# Altium footprint library Package_SO.PcbLib: 333 footprints (part 17 of 21)
Each footprint in its own frame and in the unit in brackets; x right, y up, seen from the top. Pads: shape width x height; smd on the part's side, far side on the other; paste and mask are expansions set on the pad; w line width, h text height; cw(c..) or ccw(c..) is an arc to the next point about the centre after c.
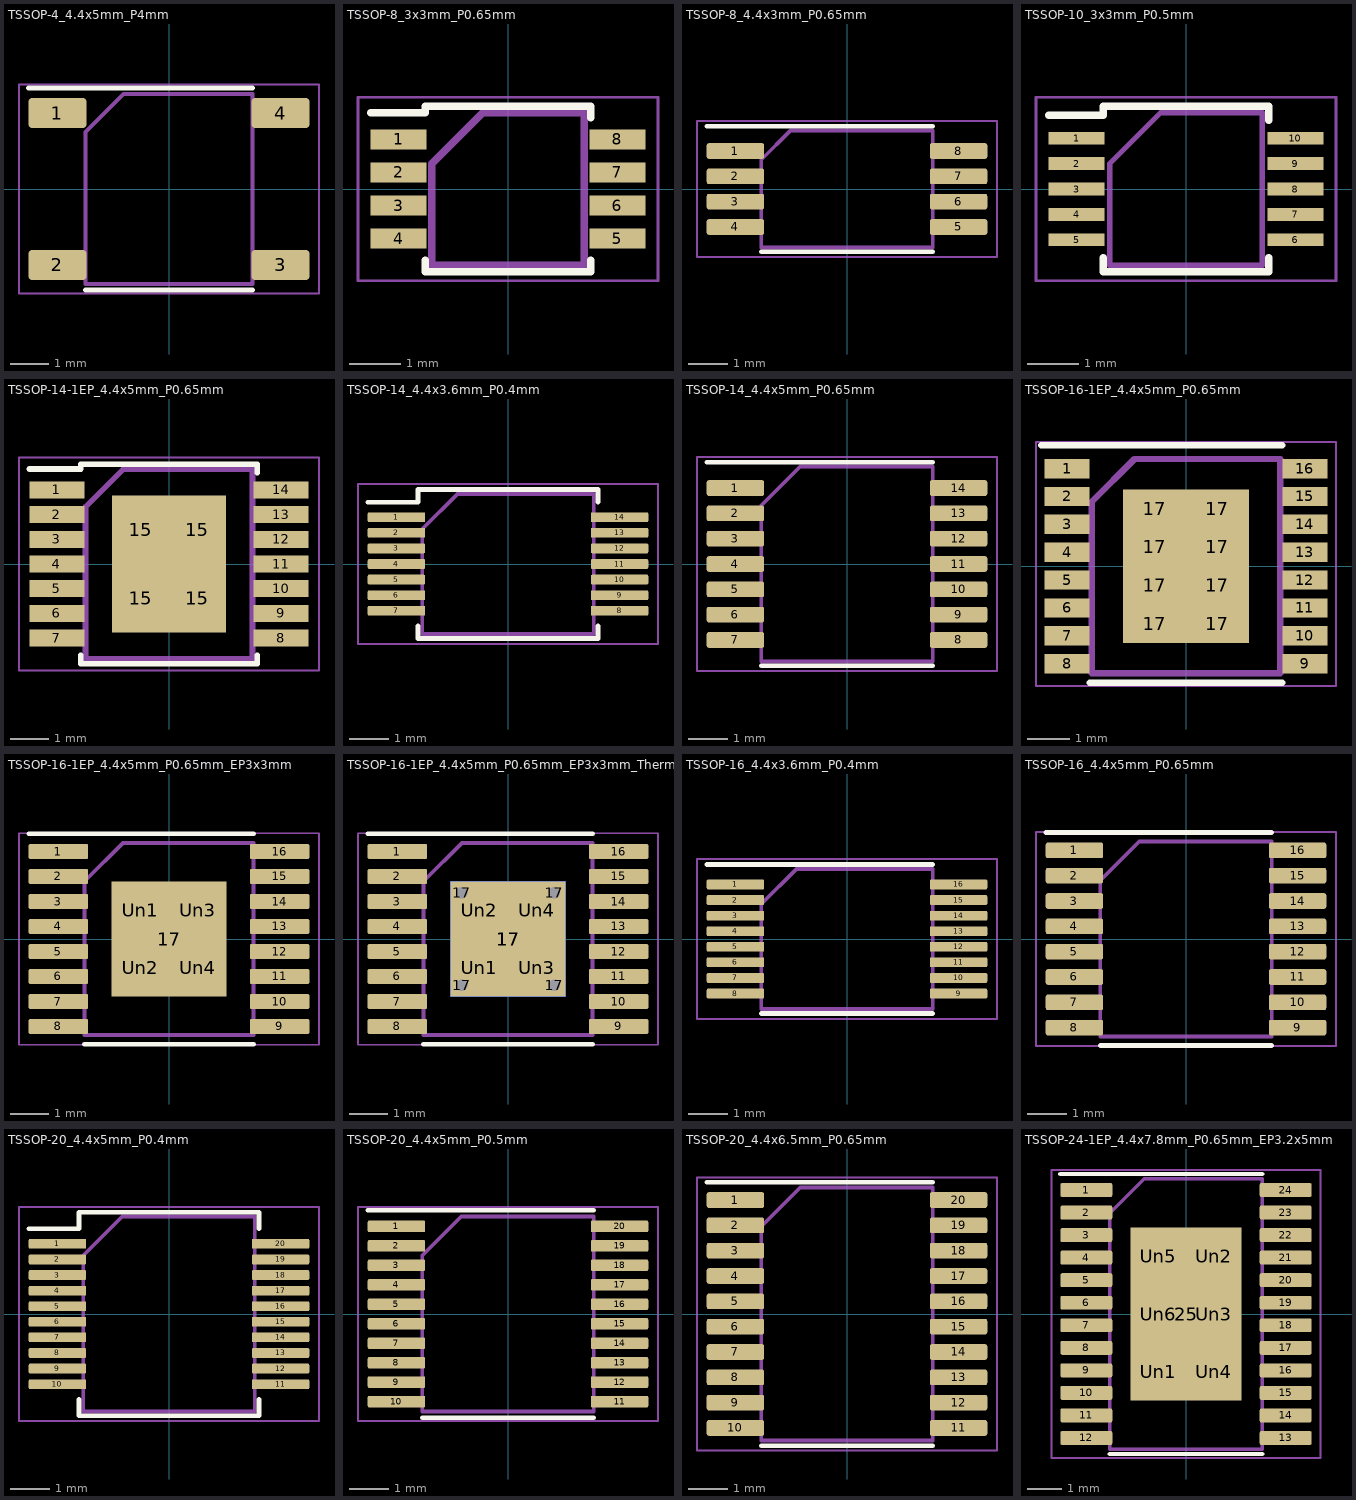
[diagram p16: the footprints below, top view; thin cyan lines are the x and y axes]

## TSSOP-4_4.4x5mm_P4mm [mm]
pads (4):
  rrect25% 1.525x0.8 smd: 1(-2.937,2) 2(-2.937,-2) 3(2.937,-2) 4(2.937,2)
F.SilkS:
  lines w0.12: -3.7,2.66 0,2.66 2.2,2.66 ; -2.2,-2.66 0,-2.66 2.2,-2.66
F.CrtYd:
  lines w0.05: -3.95,-2.75 -3.95,2.75 3.95,2.75 3.95,-2.75 -3.95,-2.75
F.Fab:
  lines w0.1: -2.2,-2.5 2.2,-2.5 2.2,2.5 -1.2,2.5 -2.2,1.5 -2.2,-2.5
  text "'.Designator'" at -4.047,-0.84 h1

## TSSOP-8_3x3mm_P0.65mm [mm]
pads (8):
  rect 1.1x0.4 smd: 1(-2.15,0.975) 2(-2.15,0.325) 3(-2.15,-0.325) 4(-2.15,-0.975) 5(2.15,-0.975) 6(2.15,-0.325) 7(2.15,0.325) 8(2.15,0.975)
F.SilkS:
  lines w0.15: -2.7,1.5 -1.625,1.5 -1.625,1.625 1.625,1.625 1.625,1.4 ; -1.625,-1.4 -1.625,-1.625 1.625,-1.625 1.625,-1.4
F.CrtYd:
  lines w0.05: -2.95,-1.8 -2.95,1.8 2.95,1.8 2.95,-1.8 -2.95,-1.8
F.Fab:
  lines w0.15: -1.5,-1.5 1.5,-1.5 1.5,1.5 -0.5,1.5 -1.5,0.5 -1.5,-1.5
  text "'.Designator'" at -2.488,-0.564 h0.6

## TSSOP-8_4.4x3mm_P0.65mm [mm]
pads (8):
  rrect25% 1.475x0.4 smd: 1(-2.863,0.975) 2(-2.863,0.325) 3(-2.863,-0.325) 4(-2.863,-0.975) 5(2.863,-0.975) 6(2.863,-0.325) 7(2.863,0.325) 8(2.863,0.975)
F.SilkS:
  lines w0.12: -3.6,1.61 0,1.61 2.2,1.61 ; -2.2,-1.61 0,-1.61 2.2,-1.61
F.CrtYd:
  lines w0.05: -3.85,-1.75 -3.85,1.75 3.85,1.75 3.85,-1.75 -3.85,-1.75
F.Fab:
  lines w0.1: -2.2,-1.5 -2.2,0.75 -1.45,1.5 2.2,1.5 2.2,-1.5 -2.2,-1.5
  text "'.Designator'" at -4.047,-0.84 h1

## TSSOP-10_3x3mm_P0.5mm [mm]
pads (10):
  rect 1.1x0.25 smd: 1(-2.15,1) 2(-2.15,0.5) 3(-2.15,0) 4(-2.15,-0.5) 5(-2.15,-1) 6(2.15,-1) 7(2.15,-0.5) 8(2.15,0) 9(2.15,0.5) 10(2.15,1)
F.SilkS:
  lines w0.15: -2.7,1.45 -1.625,1.45 -1.625,1.625 1.625,1.625 1.625,1.35 ; -1.625,-1.35 -1.625,-1.625 1.625,-1.625 1.625,-1.35
F.CrtYd:
  lines w0.05: -2.95,-1.8 -2.95,1.8 2.95,1.8 2.95,-1.8 -2.95,-1.8
F.Fab:
  lines w0.1: -1.5,-1.5 -1.5,0.5 -0.5,1.5 1.5,1.5 1.5,-1.5 -1.5,-1.5
  text "'.Designator'" at -2.438,-0.514 h0.6

## TSSOP-14-1EP_4.4x5mm_P0.65mm [mm]
pads (18):
  rect 1.45x0.45 smd: 1(-2.95,1.95) 2(-2.95,1.3) 3(-2.95,0.65) 4(-2.95,0) 5(-2.95,-0.65) 6(-2.95,-1.3) 7(-2.95,-1.95) 8(2.95,-1.95) 9(2.95,-1.3) 10(2.95,-0.65) 11(2.95,0) 12(2.95,0.65) 13(2.95,1.3) 14(2.95,1.95)
  rect 1.5x1.8 smd: 15(-0.75,-0.9) 15(-0.75,0.9) 15(0.75,-0.9) 15(0.75,0.9)
F.SilkS:
  lines w0.15: -3.675,2.5 -2.325,2.5 -2.325,2.625 2.325,2.625 2.325,2.4 ; -2.325,-2.4 -2.325,-2.625 2.325,-2.625 2.325,-2.4
F.CrtYd:
  lines w0.05: -3.95,-2.8 -3.95,2.8 3.95,2.8 3.95,-2.8 -3.95,-2.8
F.Fab:
  lines w0.15: -2.2,-2.5 2.2,-2.5 2.2,2.5 -1.2,2.5 -2.2,1.5 -2.2,-2.5
  text "'.Designator'" at -3.267,-0.702 h0.8

## TSSOP-14_4.4x3.6mm_P0.4mm [mm]
pads (14):
  rrect25% 1.475x0.25 smd: 1(-2.863,1.2) 2(-2.863,0.8) 3(-2.863,0.4) 4(-2.863,0) 5(-2.863,-0.4) 6(-2.863,-0.8) 7(-2.863,-1.2) 8(2.863,-1.2) 9(2.863,-0.8) 10(2.863,-0.4) 11(2.863,0) 12(2.863,0.4) 13(2.863,0.8) 14(2.863,1.2)
F.SilkS:
  lines w0.12: -3.6,1.585 -2.31,1.585 -2.31,1.91 0,1.91 2.31,1.91 2.31,1.585 ; -2.31,-1.585 -2.31,-1.91 0,-1.91 2.31,-1.91 2.31,-1.585
F.CrtYd:
  lines w0.05: -3.85,-2.05 3.85,-2.05 3.85,2.05 -3.85,2.05 -3.85,-2.05
F.Fab:
  lines w0.1: -2.2,-1.8 2.2,-1.8 2.2,1.8 -1.3,1.8 -2.2,0.9 -2.2,-1.8
  text "'.Designator'" at -4.047,-0.84 h1

## TSSOP-14_4.4x5mm_P0.65mm [mm]
pads (14):
  rrect25% 1.475x0.4 smd: 1(-2.863,1.95) 2(-2.863,1.3) 3(-2.863,0.65) 4(-2.863,0) 5(-2.863,-0.65) 6(-2.863,-1.3) 7(-2.863,-1.95) 8(2.863,-1.95) 9(2.863,-1.3) 10(2.863,-0.65) 11(2.863,0) 12(2.863,0.65) 13(2.863,1.3) 14(2.863,1.95)
F.SilkS:
  lines w0.12: -3.6,2.61 0,2.61 2.2,2.61 ; -2.2,-2.61 0,-2.61 2.2,-2.61
F.CrtYd:
  lines w0.05: -3.85,-2.75 -3.85,2.75 3.85,2.75 3.85,-2.75 -3.85,-2.75
F.Fab:
  lines w0.1: -2.2,-2.5 -2.2,1.5 -1.2,2.5 2.2,2.5 2.2,-2.5 -2.2,-2.5
  text "'.Designator'" at -4.047,-0.84 h1

## TSSOP-16-1EP_4.4x5mm_P0.65mm [mm]
pads (24):
  rect 1.05x0.45 smd: 1(-2.775,2.275) 2(-2.775,1.625) 3(-2.775,0.975) 4(-2.775,0.325) 5(-2.775,-0.325) 6(-2.775,-0.975) 7(-2.775,-1.625) 8(-2.775,-2.275) 9(2.775,-2.275) 10(2.775,-1.625) 11(2.775,-0.975) 12(2.775,-0.325) 13(2.775,0.325) 14(2.775,0.975) 15(2.775,1.625) 16(2.775,2.275)
  rect 1.47x0.895 smd: 17(-0.735,-1.342) 17(-0.735,-0.447) 17(-0.735,0.447) 17(-0.735,1.342) 17(0.735,-1.342) 17(0.735,-0.447) 17(0.735,0.447) 17(0.735,1.342)
F.SilkS:
  lines w0.15: -3.375,2.825 2.25,2.825 ; -2.25,-2.725 2.25,-2.725
F.CrtYd:
  lines w0.05: -3.5,-2.8 3.5,-2.8 3.5,2.9 -3.5,2.9 -3.5,-2.8
F.Fab:
  lines w0.15: -2.2,-2.5 2.2,-2.5 2.2,2.5 -1.2,2.5 -2.2,1.5 -2.2,-2.5
  text "'.Designator'" at -3.267,-0.702 h0.8

## TSSOP-16-1EP_4.4x5mm_P0.65mm_EP3x3mm [mm]
pads (21):
  rrect25% 1.55x0.4 smd: 1(-2.875,2.275) 2(-2.875,1.625) 3(-2.875,0.975) 4(-2.875,0.325) 5(-2.875,-0.325) 6(-2.875,-0.975) 7(-2.875,-1.625) 8(-2.875,-2.275) 9(2.875,-2.275) 10(2.875,-1.625) 11(2.875,-0.975) 12(2.875,-0.325) 13(2.875,0.325) 14(2.875,0.975) 15(2.875,1.625) 16(2.875,2.275)
  rect 3x3 smd: 17(0,0)
  rrect21% 1.21x1.21 on Top Paste: Un1(-0.75,0.75) Un2(-0.75,-0.75) Un3(0.75,0.75) Un4(0.75,-0.75)
F.SilkS:
  lines w0.12: -3.65,2.735 0,2.735 2.2,2.735 ; -2.2,-2.735 0,-2.735 2.2,-2.735
F.CrtYd:
  lines w0.05: -3.9,-2.75 3.9,-2.75 3.9,2.75 -3.9,2.75 -3.9,-2.75
F.Fab:
  lines w0.1: -2.2,-2.5 -2.2,1.5 -1.2,2.5 2.2,2.5 2.2,-2.5 -2.2,-2.5
  text "'.Designator'" at -4.047,-0.84 h1

## TSSOP-16-1EP_4.4x5mm_P0.65mm_EP3x3mm_ThermalVias [mm]
pads (26):
  rrect25% 1.55x0.4 smd: 1(-2.875,2.275) 2(-2.875,1.625) 3(-2.875,0.975) 4(-2.875,0.325) 5(-2.875,-0.325) 6(-2.875,-0.975) 7(-2.875,-1.625) 8(-2.875,-2.275) 9(2.875,-2.275) 10(2.875,-1.625) 11(2.875,-0.975) 12(2.875,-0.325) 13(2.875,0.325) 14(2.875,0.975) 15(2.875,1.625) 16(2.875,2.275)
  round 0.6 hole 0.3: 17(-1.2,-1.2) 17(-1.2,1.2) 17(1.2,-1.2) 17(1.2,1.2)
  rect 3x3 smd: 17(0,0)
  rect 3x3 smd far side: 17(0,0)
  rrect21% 1.21x1.21 on Top Paste: Un1(-0.75,-0.75) Un2(-0.75,0.75) Un3(0.75,-0.75) Un4(0.75,0.75)
F.SilkS:
  lines w0.12: -3.65,2.735 0,2.735 2.2,2.735 ; -2.2,-2.735 0,-2.735 2.2,-2.735
F.CrtYd:
  lines w0.05: -3.9,-2.75 3.9,-2.75 3.9,2.75 -3.9,2.75 -3.9,-2.75
F.Fab:
  lines w0.1: -2.2,-2.5 -2.2,1.5 -1.2,2.5 2.2,2.5 2.2,-2.5 -2.2,-2.5
  text "'.Designator'" at -4.047,-0.84 h1

## TSSOP-16_4.4x3.6mm_P0.4mm [mm]
pads (16):
  rrect25% 1.475x0.25 smd: 1(-2.863,1.4) 2(-2.863,1) 3(-2.863,0.6) 4(-2.863,0.2) 5(-2.863,-0.2) 6(-2.863,-0.6) 7(-2.863,-1) 8(-2.863,-1.4) 9(2.863,-1.4) 10(2.863,-1) 11(2.863,-0.6) 12(2.863,-0.2) 13(2.863,0.2) 14(2.863,0.6) 15(2.863,1) 16(2.863,1.4)
F.SilkS:
  lines w0.12: -3.6,1.91 0,1.91 2.2,1.91 ; -2.2,-1.91 0,-1.91 2.2,-1.91
F.CrtYd:
  lines w0.05: -3.85,-2.05 -3.85,2.05 3.85,2.05 3.85,-2.05 -3.85,-2.05
F.Fab:
  lines w0.1: -2.2,-1.8 2.2,-1.8 2.2,1.8 -1.3,1.8 -2.2,0.9 -2.2,-1.8
  text "'.Designator'" at -4.047,-0.84 h1

## TSSOP-16_4.4x5mm_P0.65mm [mm]
pads (16):
  rrect25% 1.475x0.4 smd: 1(-2.863,2.275) 2(-2.863,1.625) 3(-2.863,0.975) 4(-2.863,0.325) 5(-2.863,-0.325) 6(-2.863,-0.975) 7(-2.863,-1.625) 8(-2.863,-2.275) 9(2.863,-2.275) 10(2.863,-1.625) 11(2.863,-0.975) 12(2.863,-0.325) 13(2.863,0.325) 14(2.863,0.975) 15(2.863,1.625) 16(2.863,2.275)
F.SilkS:
  lines w0.12: -3.6,2.735 0,2.735 2.2,2.735 ; -2.2,-2.735 0,-2.735 2.2,-2.735
F.CrtYd:
  lines w0.05: -3.85,-2.75 3.85,-2.75 3.85,2.75 -3.85,2.75 -3.85,-2.75
F.Fab:
  lines w0.1: -2.2,-2.5 2.2,-2.5 2.2,2.5 -1.2,2.5 -2.2,1.5 -2.2,-2.5
  text "'.Designator'" at -3.897,-0.357 h1
3D body "TSSOP-16-1EP_4.4x5mm_P0.65mm.step": height 1.1, standoff 0, extent -3.2,-2.5 3.2,2.5

## TSSOP-20_4.4x5mm_P0.4mm [mm]
pads (20):
  rrect25% 1.475x0.25 smd: 1(-2.863,1.8) 2(-2.863,1.4) 3(-2.863,1) 4(-2.863,0.6) 5(-2.863,0.2) 6(-2.863,-0.2) 7(-2.863,-0.6) 8(-2.863,-1) 9(-2.863,-1.4) 10(-2.863,-1.8) 11(2.863,-1.8) 12(2.863,-1.4) 13(2.863,-1) 14(2.863,-0.6) 15(2.863,-0.2) 16(2.863,0.2) 17(2.863,0.6) 18(2.863,1) 19(2.863,1.4) 20(2.863,1.8)
F.SilkS:
  lines w0.12: -3.6,2.185 -2.31,2.185 -2.31,2.61 0,2.61 2.31,2.61 2.31,2.185 ; -2.31,-2.185 -2.31,-2.61 0,-2.61 2.31,-2.61 2.31,-2.185
F.CrtYd:
  lines w0.05: -3.85,-2.75 3.85,-2.75 3.85,2.75 -3.85,2.75 -3.85,-2.75
F.Fab:
  lines w0.1: -2.2,-2.5 2.2,-2.5 2.2,2.5 -1.2,2.5 -2.2,1.5 -2.2,-2.5
  text "'.Designator'" at -4.047,-0.84 h1

## TSSOP-20_4.4x5mm_P0.5mm [mm]
pads (20):
  rrect25% 1.475x0.3 smd: 1(-2.863,2.25) 2(-2.863,1.75) 3(-2.863,1.25) 4(-2.863,0.75) 5(-2.863,0.25) 6(-2.863,-0.25) 7(-2.863,-0.75) 8(-2.863,-1.25) 9(-2.863,-1.75) 10(-2.863,-2.25) 11(2.863,-2.25) 12(2.863,-1.75) 13(2.863,-1.25) 14(2.863,-0.75) 15(2.863,-0.25) 16(2.863,0.25) 17(2.863,0.75) 18(2.863,1.25) 19(2.863,1.75) 20(2.863,2.25)
F.SilkS:
  lines w0.12: -3.6,2.66 0,2.66 2.2,2.66 ; -2.2,-2.66 0,-2.66 2.2,-2.66
F.CrtYd:
  lines w0.05: -3.85,-2.75 -3.85,2.75 3.85,2.75 3.85,-2.75 -3.85,-2.75
F.Fab:
  lines w0.1: -2.2,-2.5 2.2,-2.5 2.2,2.5 -1.2,2.5 -2.2,1.5 -2.2,-2.5
  text "'.Designator'" at -4.047,-0.84 h1

## TSSOP-20_4.4x6.5mm_P0.65mm [mm]
pads (20):
  rrect25% 1.475x0.4 smd: 1(-2.863,2.925) 2(-2.863,2.275) 3(-2.863,1.625) 4(-2.863,0.975) 5(-2.863,0.325) 6(-2.863,-0.325) 7(-2.863,-0.975) 8(-2.863,-1.625) 9(-2.863,-2.275) 10(-2.863,-2.925) 11(2.863,-2.925) 12(2.863,-2.275) 13(2.863,-1.625) 14(2.863,-0.975) 15(2.863,-0.325) 16(2.863,0.325) 17(2.863,0.975) 18(2.863,1.625) 19(2.863,2.275) 20(2.863,2.925)
F.SilkS:
  lines w0.12: -3.6,3.385 0,3.385 2.2,3.385 ; -2.2,-3.385 0,-3.385 2.2,-3.385
F.CrtYd:
  lines w0.05: -3.85,-3.5 -3.85,3.5 3.85,3.5 3.85,-3.5 -3.85,-3.5
F.Fab:
  lines w0.1: -2.2,-3.25 -2.2,2.25 -1.2,3.25 2.2,3.25 2.2,-3.25 -2.2,-3.25
  text "'.Designator'" at -4.047,-0.84 h1

## TSSOP-24-1EP_4.4x7.8mm_P0.65mm_EP3.2x5mm [mm]
pads (31):
  rrect25% 1.5x0.4 smd: 1(-2.875,3.575) 2(-2.875,2.925) 3(-2.875,2.275) 4(-2.875,1.625) 5(-2.875,0.975) 6(-2.875,0.325) 7(-2.875,-0.325) 8(-2.875,-0.975) 9(-2.875,-1.625) 10(-2.875,-2.275) 11(-2.875,-2.925) 12(-2.875,-3.575) 13(2.875,-3.575) 14(2.875,-2.925) 15(2.875,-2.275) 16(2.875,-1.625) 17(2.875,-0.975) 18(2.875,-0.325) 19(2.875,0.325) 20(2.875,0.975) 21(2.875,1.625) 22(2.875,2.275) 23(2.875,2.925) 24(2.875,3.575)
  rect 3.2x5 smd: 25(0,0)
  rrect19% 1.29x1.34 on Top Paste: Un1(-0.8,-1.67) Un2(0.8,1.67) Un3(0.8,0) Un4(0.8,-1.67) Un5(-0.8,1.67) Un6(-0.8,0)
F.SilkS:
  lines w0.12: -3.625,4.035 0,4.035 2.2,4.035 ; -2.2,-4.035 0,-4.035 2.2,-4.035
F.CrtYd:
  lines w0.05: -3.88,-4.15 3.88,-4.15 3.88,4.15 -3.88,4.15 -3.88,-4.15
F.Fab:
  lines w0.1: -2.2,-3.9 -2.2,2.9 -1.2,3.9 2.2,3.9 2.2,-3.9 -2.2,-3.9
  text "'.Designator'" at -4.047,-0.84 h1